# Altium footprint library 排针排座.PcbLib: 344 footprints (part 1 of 22)
Each footprint in its own frame and in the unit in brackets; x right, y up, seen from the top. Pads: shape width x height; smd on the part's side, far side on the other; paste and mask are expansions set on the pad; w line width, h text height; cw(c..) or ccw(c..) is an arc to the next point about the centre after c.
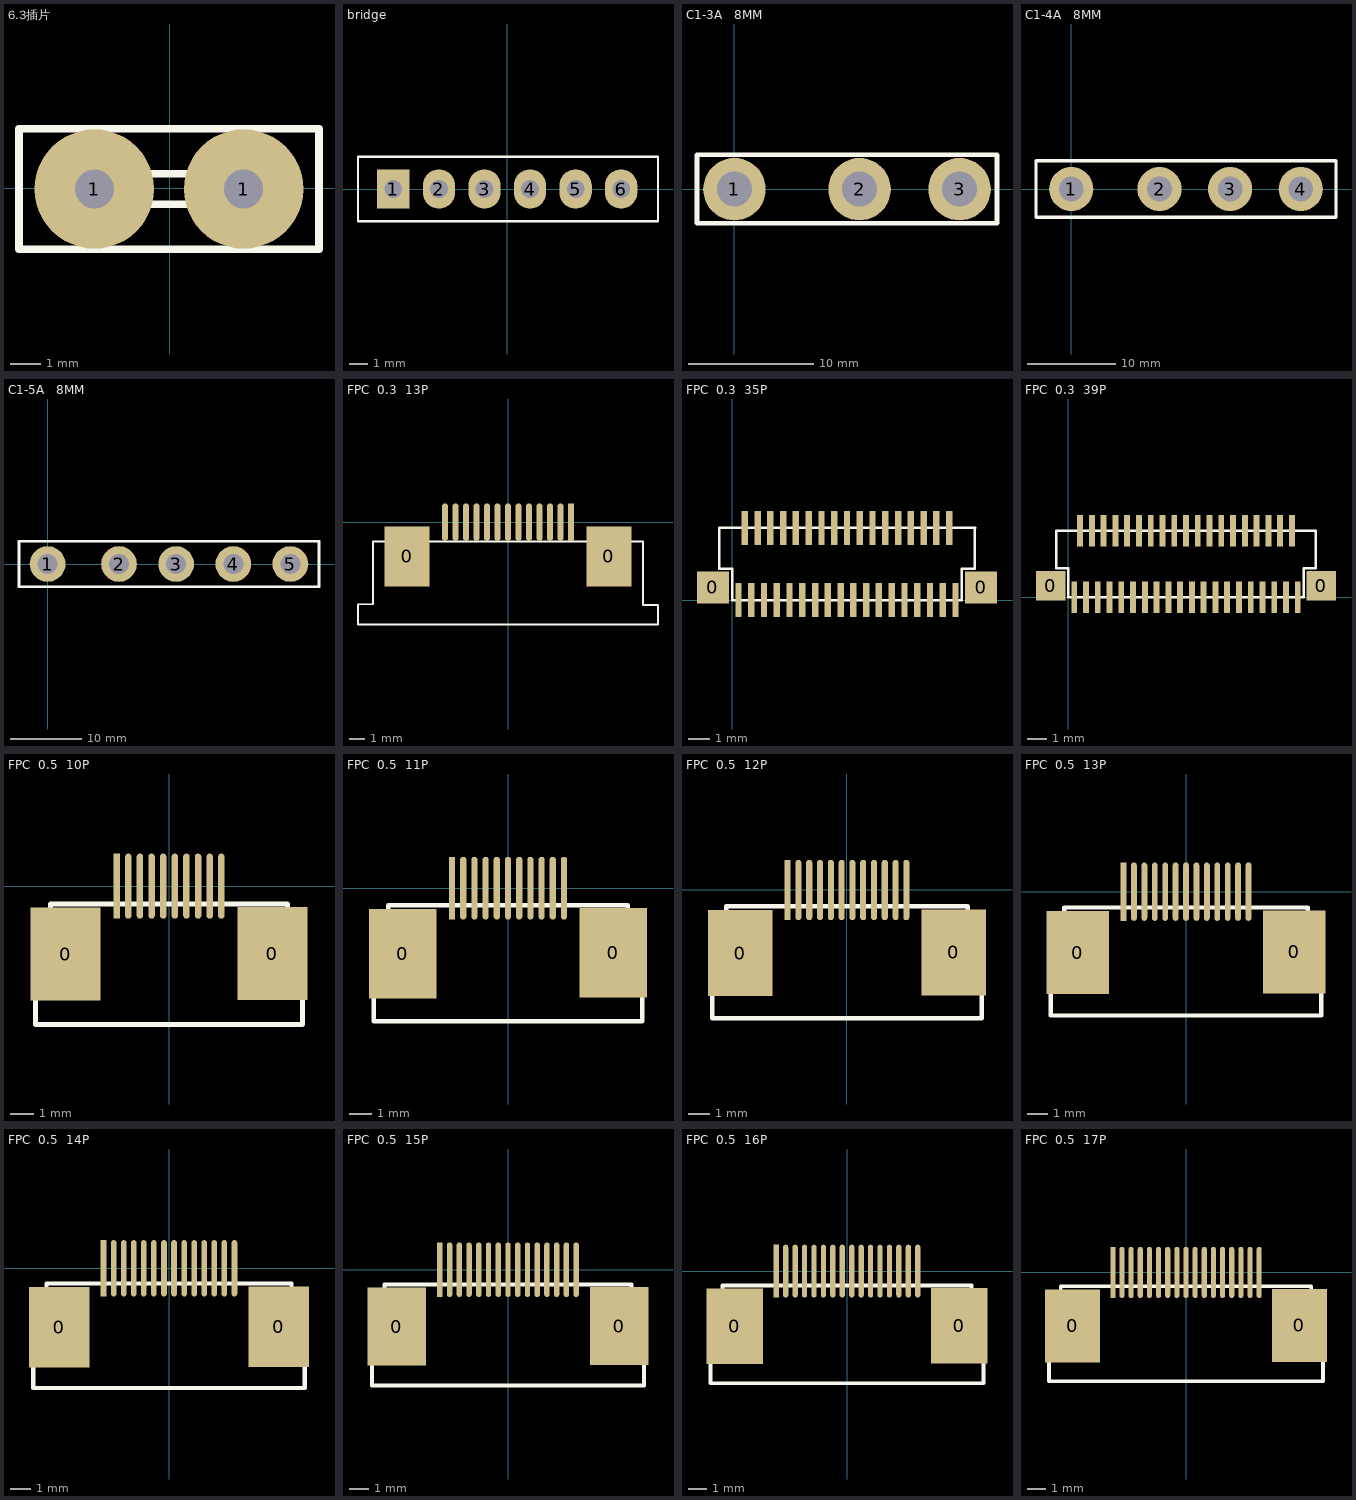
[diagram p0: the footprints below, top view; thin cyan lines are the x and y axes]

## 6.3插片 [mil]
pads (2):
  round 157 hole 51.18: 1(-99,-1) 1(97,-1)
Top Overlay:
  lines w10: -129,-21 -129,19 ; -80,-21 -80,19 ; 78,-21 78,19 ; 127,-21 127,19 ; 196,-21 196,78 -198,78 -198,-80 196,-80 196,-1 ; -158,-21 -158,19 156,19 156,-1 156,-21 -158,-21
3D body "6.3插?": height 405.12, standoff -146.58, extent -157.48,-43.54 157.48,43.05

## bridge [mil] "手机唛支架"
height 59.06
pads (6):
  rect 70x85 hole 38: 1(-246.06,0)
  oval 70x85 hole 38: 2(-147.64,0) 3(-49.21,0) 4(49.21,0) 5(147.64,0) 6(246.06,0)
Top Overlay:
  lines w5: -322.64,-70 -322.64,70 325.79,70 325.79,-70 -322.64,-70

## C1-3A   8MM [mm] "CA-3A直插座"
height 12.8
pads (3):
  round 5 hole 2.8: 1(0,0) 2(10,0) 3(18,0)
Top Overlay:
  lines w0.381: -3,-2.718 21,-2.718 21,2.743 -3,2.743 -3,-2.718
3D body "C1-3A直插座.st": height 12.6, standoff -4, extent -2.983,-2.485 21.017,2.515

## C1-4A   8MM [mm] "CA-4A直插座"
height 12.8
pads (4):
  round 5 hole 2.8: 1(0,0) 2(10,0) 3(18,0) 4(26,0)
Top Overlay:
  lines w0.381: -4,-3.2 -4,3.2 30,3.2 30,-3.2 -4,-3.2
3D body "C1-4A直插座.st": height 13, standoff -3.5, extent -3.988,-3.2 30.012,3.2

## C1-5A   8MM [mm] "CA-5A直插座"
height 12.8
pads (5):
  round 5 hole 2.8: 1(0,0) 2(10,0) 3(18,0) 4(26,0) 5(34,0)
Top Overlay:
  lines w0.381: -4,-3.2 -4,3.2 38,3.2 38,-3.2 -4,-3.2
3D body "C1-5A直插座.st": height 13, standoff -3.5, extent -3.937,-3.124 38.063,3.276

## FPC  0.3  13P [mm] "13 Pins"
height 2
pads (15):
  rect 3x4 smd: 0(-6.72,-2.289) 0(6.72,-2.289)
  rect 0.4x2.5 smd: 1(4.2,0)
  oval 0.4x2.5 smd: 2(3.5,0) 3(2.8,0) 4(2.1,0) 5(1.4,0) 6(0.7,0) 7(0,0) 8(-0.7,0) 9(-1.4,0) 10(-2.1,0) 11(-2.8,0) 12(-3.5,0) 13(-4.2,0)
Top Overlay:
  lines w0.127: -10,-6.833 10,-6.833 10,-5.513 9,-5.513 9,-1.293 -9,-1.293 -9,-5.474 -10,-5.474 -10,-6.833

## FPC  0.3  35P [mm]
height 1
pads (41):
  rect 1.5x1.5 smd: 0(-0.9,0.6) 0(11.7,0.6)
  rect 0.3x1.6 smd: 1(0.3,0) 2(0.6,3.4) 3(0.9,0) 4(1.2,3.4) 5(1.5,0) 6(1.8,3.4) 7(2.1,0) 8(2.4,3.4) 9(2.7,0) 10(3,3.4) 11(3.3,0) 12(3.6,3.4) 13(3.9,0) 14(4.2,3.4) 15(4.5,0) 16(4.8,3.4) 17(5.1,0) 18(5.4,3.4) 19(5.7,0) 20(6,3.4) 21(6.3,0) 22(6.6,3.4) 23(6.9,0) 24(7.2,3.4) 25(7.5,0) 26(7.8,3.4) 27(8.1,0) 28(8.4,3.4) 29(8.7,0) 30(9,3.4) 31(9.3,0) 32(9.6,3.4) 33(9.9,0) 34(10.2,3.4) 35(10.5,0) 36(9.6,3.4) 37(9.9,0) 38(10.2,3.4) 39(10.5,0)
Top Overlay:
  lines w0.127: -0.61,3.396 -0.61,1.473 0,1.473 0,0 10.8,0 10.8,1.473 11.41,1.473 11.41,3.396 11.413,3.4 10.8,3.4 -0.61,3.4
3D body "FPC  0.3  35P_3.step": height 1, standoff 0, extent -0.584,-0.243 11.416,3.4

## FPC  0.3  39P [mm] "2006用"
height 1
pads (41):
  rect 1.5x1.5 smd: 0(-0.9,0.6) 0(12.9,0.6)
  rect 0.3x1.6 smd: 1(0.3,0) 2(0.6,3.4) 3(0.9,0) 4(1.2,3.4) 5(1.5,0) 6(1.8,3.4) 7(2.1,0) 8(2.4,3.4) 9(2.7,0) 10(3,3.4) 11(3.3,0) 12(3.6,3.4) 13(3.9,0) 14(4.2,3.4) 15(4.5,0) 16(4.8,3.4) 17(5.1,0) 18(5.4,3.4) 19(5.7,0) 20(6,3.4) 21(6.3,0) 22(6.6,3.4) 23(6.9,0) 24(7.2,3.4) 25(7.5,0) 26(7.8,3.4) 27(8.1,0) 28(8.4,3.4) 29(8.7,0) 30(9,3.4) 31(9.3,0) 32(9.6,3.4) 33(9.9,0) 34(10.2,3.4) 35(10.5,0) 36(10.8,3.4) 37(11.1,0) 38(11.4,3.4) 39(11.7,0)
Top Overlay:
  lines w0.127: -0.61,3.396 -0.61,1.473 0,1.473 0,0 12,0 12,1.473 12.61,1.473 12.61,3.396 ; -0.61,3.4 12.598,3.4
3D body "FPC  0.3  39P_2.step": height 1, standoff 0, extent -0.606,-0.254 12.594,3.39

## FPC  0.5  10P [mm]
height 2
pads (12):
  rect 3x4 smd: 0(-4.454,-2.921) 0(4.446,-2.896)
  rect 0.28x2.8 smd: 1(-2.254,0)
  oval 0.28x2.8 smd: 2(-1.754,0) 3(-1.254,0) 4(-0.754,0) 5(-0.254,0) 6(0.246,0) 7(0.746,0) 8(1.246,0) 9(1.746,0) 10(2.246,0)
Top Overlay:
  lines w0.203: -5.746,-5.944 5.738,-5.944 5.738,-4.624 5.14,-4.624 5.088,-4.572 5.088,-0.762 -5.096,-0.762 -5.096,-4.572 -5.148,-4.624 -5.746,-4.624 -5.746,-5.944
3D body "FPC  0.5  10P.step": height 2, standoff 0, extent -5.65,-6 5.65,0

## FPC  0.5  11P [mm]
height 2
pads (13):
  rect 3x4 smd: 0(-4.7,-2.921) 0(4.7,-2.896)
  rect 0.28x2.8 smd: 1(-2.5,0)
  oval 0.28x2.8 smd: 2(-2,0) 3(-1.5,0) 4(-1,0) 5(-0.5,0) 6(0,0) 7(0.5,0) 8(1,0) 9(1.5,0) 10(2,0) 11(2.5,0)
Top Overlay:
  lines w0.203: -5.992,-5.944 -5.992,-4.624 -5.394,-4.624 -5.342,-4.572 -5.342,-0.762 5.342,-0.762 5.342,-4.572 5.394,-4.624 5.992,-4.624 5.992,-5.944 -5.992,-5.944
3D body "FPC  0.5  11P.step": height 2, standoff 0, extent -5.9,-6 5.9,0

## FPC  0.5  12P [mm]
height 2
pads (14):
  rect 3x4 smd: 0(-4.947,-2.921) 0(4.953,-2.896)
  rect 0.28x2.8 smd: 1(-2.747,0)
  oval 0.28x2.8 smd: 2(-2.247,0) 3(-1.747,0) 4(-1.247,0) 5(-0.747,0) 6(-0.247,0) 7(0.253,0) 8(0.753,0) 9(1.253,0) 10(1.753,0) 11(2.253,0) 12(2.753,0)
Top Overlay:
  lines w0.203: -6.239,-5.944 6.244,-5.944 6.244,-4.624 5.646,-4.624 5.594,-4.572 5.594,-0.762 -5.589,-0.762 -5.589,-4.572 -5.641,-4.624 -6.239,-4.624 -6.239,-5.944
3D body "FPC  0.5  12P.step": height 2, standoff 0, extent -6.15,-6 6.15,0

## FPC  0.5  13P [mm]
height 2
pads (15):
  rect 3x4 smd: 0(-5.2,-2.921) 0(5.2,-2.896)
  rect 0.28x2.8 smd: 1(-3,0)
  oval 0.28x2.8 smd: 2(-2.5,0) 3(-2,0) 4(-1.5,0) 5(-1,0) 6(-0.5,0) 7(0,0) 8(0.5,0) 9(1,0) 10(1.5,0) 11(2,0) 12(2.5,0) 13(3,0)
Top Overlay:
  lines w0.203: -6.492,-5.944 6.492,-5.944 6.492,-4.624 5.894,-4.624 5.842,-4.572 5.842,-0.762 -5.842,-0.762 -5.842,-4.572 -5.894,-4.624 -6.492,-4.624 -6.492,-5.944
3D body "FPC  0.5  13P.step": height 2, standoff 0, extent -6.4,-6 6.4,0

## FPC  0.5  14P [mm]
height 2
pads (16):
  rect 3x4 smd: 0(-5.455,-2.921) 0(5.445,-2.896)
  rect 0.28x2.8 smd: 1(-3.255,0)
  oval 0.28x2.8 smd: 2(-2.755,0) 3(-2.255,0) 4(-1.755,0) 5(-1.255,0) 6(-0.755,0) 7(-0.255,0) 8(0.245,0) 9(0.745,0) 10(1.245,0) 11(1.745,0) 12(2.245,0) 13(2.745,0) 14(3.245,0)
Top Overlay:
  lines w0.203: -6.747,-5.944 6.736,-5.944 6.736,-4.624 6.138,-4.624 6.086,-4.572 6.086,-0.762 -6.097,-0.762 -6.097,-4.572 -6.149,-4.624 -6.747,-4.624 -6.747,-5.944
3D body "FPC  0.5  14P.step": height 2, standoff 0, extent -6.65,-6 6.65,0

## FPC  0.5  15P [mm]
height 2
pads (17):
  rect 3x4 smd: 0(-5.7,-2.921) 0(5.7,-2.896)
  rect 0.28x2.8 smd: 1(-3.5,0)
  oval 0.28x2.8 smd: 2(-3,0) 3(-2.5,0) 4(-2,0) 5(-1.5,0) 6(-1,0) 7(-0.5,0) 8(0,0) 9(0.5,0) 10(1,0) 11(1.5,0) 12(2,0) 13(2.5,0) 14(3,0) 15(3.5,0)
Top Overlay:
  lines w0.203: -6.992,-5.944 -6.992,-4.624 -6.394,-4.624 -6.342,-4.572 -6.342,-0.762 6.342,-0.762 6.342,-4.572 6.394,-4.624 6.992,-4.624 6.992,-5.944 -6.992,-5.944
3D body "FPC  0.5  15P.step": height 2, standoff 0, extent -6.9,-6 6.9,0

## FPC  0.5  16P [mm]
height 2
pads (18):
  rect 3x4 smd: 0(-5.963,-2.921) 0(5.937,-2.896)
  rect 0.28x2.8 smd: 1(-3.763,0)
  oval 0.28x2.8 smd: 2(-3.263,0) 3(-2.763,0) 4(-2.263,0) 5(-1.763,0) 6(-1.263,0) 7(-0.763,0) 8(-0.263,0) 9(0.237,0) 10(0.737,0) 11(1.237,0) 12(1.737,0) 13(2.237,0) 14(2.737,0) 15(3.237,0) 16(3.737,0)
Top Overlay:
  lines w0.203: -7.255,-5.944 7.228,-5.944 7.228,-4.624 6.63,-4.624 6.578,-4.572 6.578,-0.762 -6.605,-0.762 -6.605,-4.572 -6.657,-4.624 -7.255,-4.624 -7.255,-5.944
3D body "FPC  0.5  16P.step": height 2, standoff 0, extent -7.15,-6 7.15,0

## FPC  0.5  17P [mm]
height 2
pads (19):
  rect 3x4 smd: 0(-6.2,-2.921) 0(6.2,-2.896)
  rect 0.28x2.8 smd: 1(-4,0)
  oval 0.28x2.8 smd: 2(-3.5,0) 3(-3,0) 4(-2.5,0) 5(-2,0) 6(-1.5,0) 7(-1,0) 8(-0.5,0) 9(0,0) 10(0.5,0) 11(1,0) 12(1.5,0) 13(2,0) 14(2.5,0) 15(3,0) 16(3.5,0) 17(4,0)
Top Overlay:
  lines w0.203: -7.492,-5.944 -7.492,-4.624 -6.894,-4.624 -6.842,-4.572 -6.842,-0.762 6.842,-0.762 6.842,-4.572 6.894,-4.624 7.492,-4.624 7.492,-5.944 -7.492,-5.944
3D body "FPC  0.5  17P.step": height 2, standoff 0, extent -7.4,-6 7.4,0